# Altium schematic symbol library Schlib.SchLib: 725 symbols (part 6 of 6)
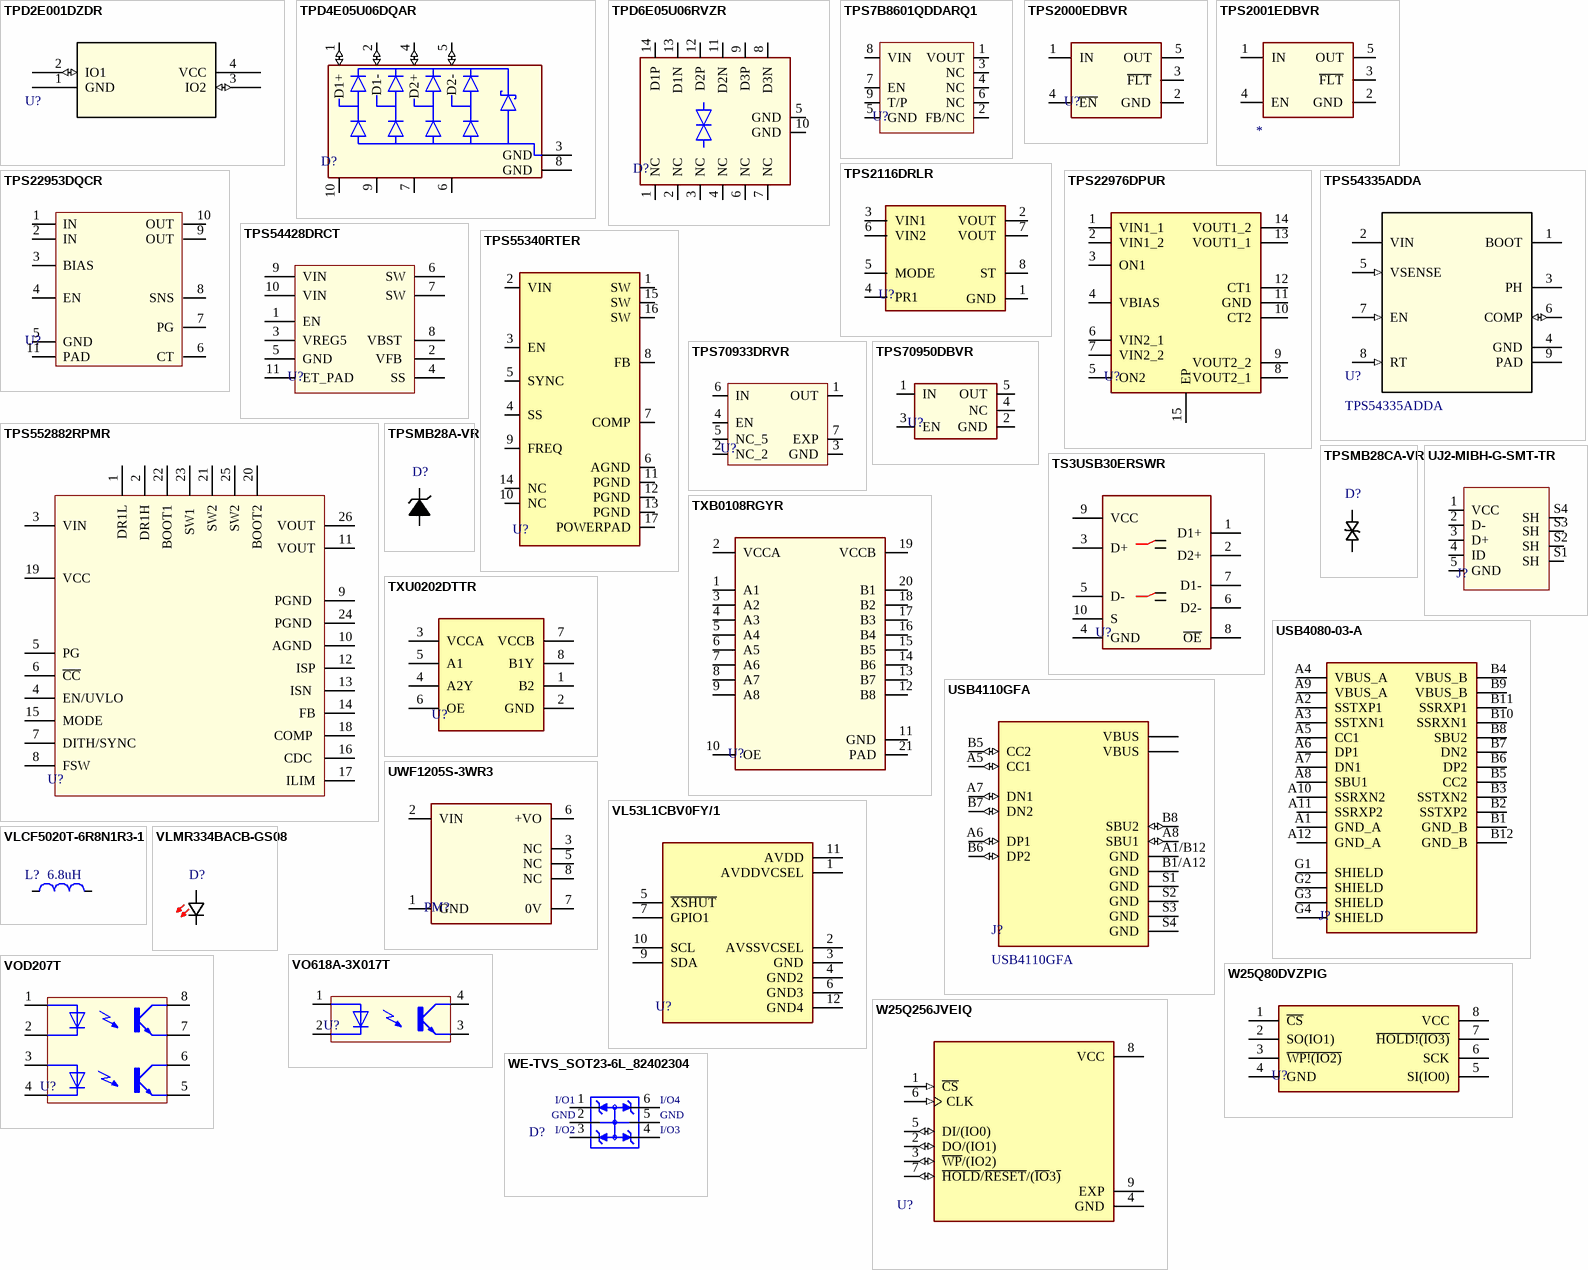
[diagram p26: symbols TPD2E001DZDR to WE-TVS_SOT23-6L_82402304]

## TPD4E05U06DQAR
designator D?  (value not drawn)
Quad 0.5-pF, 5.5-V, ±12-kV ESD protection diode for USB, HDMI & High Speed Interfaces; Manufacturer: Texas Instruments; Manufacturer Part Number: TPD4E05U06DQAR; Direction: Unidirectional; Clamping Voltage: 14V; Working Voltage: 5.5V; Value: 0.5pF; Number of Bidirectional Channels: 4; Min Breakdown Voltage: 6V; Peak Pulse Power: 40W; Power Line Protection: Yes; Leakage Current: 10nA; Peak Pulse Current: 2.5A; Interface: LVDS,USB,Ethernet,HDMI,PCIe,SATA; Supplier: Digi-Key; Supplier Part Number: 296-35765-1-ND; RoHS: Yes; Category: Integrated Circuits (ICs); Stock: 300543; Pricing: 1=0.73000, 10=0.64300, 100=0.49310, 500=0.38980, 1000=0.31184 (USD); Mounting Technology: Surface Mount; Case/Package: SON; Pins: 10; Contact Plating: Gold; Min Operating Temperature: -40°C; Max Operating Temperature: 125°C; Packaging: Tape and Reel; Package Quantity: 3000; Polarity: Unidirectional; Reverse Standoff Voltage: 5.5V; Number of Channels: 4; Breakdown Voltage: 6V; Max Power Dissipation: 40W; Termination: SMD/SMT; Operating Supply Voltage: 5.5V; Series: -; Number of Unidirectional Channels: 4; Length: 2.6mm; Depth: 1.1mm; Radiation Hardening: No; Reach SVHC Compliant: Yes; Lead Free: Lead Free; RoHS Compliant: Yes; ComponentLink1URL: https://datasheet.ciiva.com/15063/tpd4e05u06-15063653.pdf?src-supplier=Digi-Key; ComponentLink1Description: https://datasheet.ciiva.com/15063/tpd4e05u06-15063653.pdf?src-supplier=Digi-Key; ComponentLink2URL: https://datasheet.ciiva.com/24119/slvsbo7f-316827-24119436.pdf?src-supplier=Mouser; ComponentLink2Description: https://datasheet.ciiva.com/24119/slvsbo7f-316827-24119436.pdf?src-supplier=Mouser; ComponentLink3URL: https://datasheet.ciiva.com/26918/getdatasheetpartid-716763-26918024.pdf?src-supplier=Verical; ComponentLink3Description: https://datasheet.ciiva.com/26918/getdatasheetpartid-716763-26918024.pdf?src-supplier=Verical; ComponentLink4URL: https://datasheet.ciiva.com/15063/tpd4e05u06-15063654.pdf?src-supplier=Digi-Key; ComponentLink4Description: https://datasheet.ciiva.com/15063/tpd4e05u06-15063654.pdf?src-supplier=Digi-Key; ComponentLink5URL: https://datasheet.ciiva.com/15063/tpd4e05u06-15063655.pdf?src-supplier=Digi-Key; ComponentLink5Description: https://datasheet.ciiva.com/15063/tpd4e05u06-15063655.pdf?src-supplier=Digi-Key; ComponentLink6URL: https://datasheet.ciiva.com/29883/tpd4e05u06-29883798.pdf?src-supplier=Avnet; ComponentLink6Description: https://datasheet.ciiva.com/29883/tpd4e05u06-29883798.pdf?src-supplier=Avnet
footprint TPD4E05U06DQAR
pins: 1 D1+ (io), 2 D1- (io), 3 GND (power), 4 D2+ (io), 5 D2- (io), 6 NC_6, 7 NC_7, 8 GND (power), 9 NC_9, 10 NC_10

## TPD6E05U06RVZR
designator D?  (value not drawn)
ESD Suppressor Diode Array ±15kV@Air Gap/±12kV@Contact Disc 14-Pin UQFN T/R; Manufacturer: Texas Instruments; Manufacturer Part Number: TPD6E05U06RVZR; Direction: Unidirectional; Number of Bidirectional Channels: 6; Reverse Standoff Voltage: 5.5V; Min Breakdown Voltage: 6V; Clamping Voltage: 14V; Peak Pulse Power: 40W; Power Line Protection: Yes; Polarity: Bidirectional; Leakage Current: 10nA; Peak Pulse Current: 2.5A; Interface: LVDS,USB,Ethernet,HDMI,PCIe,SATA; Supplier: Digi-Key; Supplier Part Number: 296-39349-1-ND; RoHS: Yes; Category: ESD and Circuit Protection ICs; Stock: 69689; Pricing: 1=0.99000, 10=0.88400, 100=0.68900, 500=0.56918, 1000=0.44935 (USD); Mounting Technology: Surface Mount; Pins: 14; Min Operating Temperature: -40°C; Max Operating Temperature: 125°C; Packaging: Tape and Reel; Package Quantity: 3000; Number of Channels: 6; Breakdown Voltage: 6V; Termination: SMD/SMT; Max Power Dissipation: 40W; Working Voltage: 5.5V; Length: 3.6mm; Depth: 1.45mm; Radiation Hardening: No; Lead Free: Lead Free; RoHS Compliant: Yes; ComponentLink1URL: https://datasheet.ciiva.com/29883/tpd6e05u06-29883847.pdf?src-supplier=Avnet; ComponentLink1Description: https://datasheet.ciiva.com/29883/tpd6e05u06-29883847.pdf?src-supplier=Avnet; ComponentLink2URL: https://datasheet.ciiva.com/26918/getdatasheetpartid-747210-26918045.pdf?src-supplier=Verical; ComponentLink2Description: https://datasheet.ciiva.com/26918/getdatasheetpartid-747210-26918045.pdf?src-supplier=Verical
footprint TPD6E05U06RVZR
pins: 1 NC, 2 NC, 3 NC, 4 NC, 5 GND (power), 6 NC, 7 NC, 8 D3N (io), 9 D3P (io), 10 GND (power), 11 D2N (io), 12 D2P (io), 13 D1N (io), 14 D1P (io)

## TPS7B8601QDDARQ1
designator U?  (value not drawn)
Automotive 500-mA, 40-V, ultra-low-IQ, low-dropout (LDO) linear regulator with power good 8-SO PowerPAD -40 to 150; Manufacturer: Texas Instruments; Manufacturer Part Number: TPS7B8601QDDARQ1; Supplier: Mouser; Supplier Part Number: 595-TPS7B8601QDDARQ1; RoHS: Yes; Category: Integrated Circuits (ICs); Stock: 7301; Pricing: 1=2.19, 10=1.86, 50=1.86, 100=1.58, 1000=1.08, 10000=0.975 (USD); RoHS Compliant: Yes
footprint TPS7B8601QDDARQ1
pins: 1 VOUT, 2 FB/NC, 3 NC, 4 NC, 5 GND, 6 NC, 7 EN, 8 VIN, 9 T/P

## TPS2000EDBVR
designator U?  (value not drawn)
2-A loading, 2.7-V to 5.5-V, 70-mΩ USB power switch, active low, output discharge, reverse blocking 5-SOT-23 -40 to 125; Manufacturer: Texas Instruments; Manufacturer Part Number: TPS2000EDBVR; Supplier: Mouser; Supplier Part Number: 595-TPS2000EDBVR; RoHS: No; Stock: 5278; Pricing: 1=0.29, 10=0.196, 50=0.174, 100=0.15, 1000=0.125, 10000=0.11 (USD)
footprint SOT-23-5
pins: 1 IN, 2 GND, 3 ~{FLT}, 4 ~{EN}, 5 OUT

## TPS2001EDBVR
designator U?
2-A loading, 2.7-V to 5.5-V, 70-mΩ USB power switch, active high, output discharge, reverse blocking 5-SOT-23 -40 to...; Manufacturer: Texas Instruments; Manufacturer Part Number: TPS2001EDBVR; Supplier: Mouser; Supplier Part Number: 595-TPS2001EDBVR; RoHS: No; Stock: 5271; Pricing: 1=0.29, 10=0.196, 50=0.174, 100=0.15, 1000=0.125, 10000=0.11 (USD); Case/Package: SOT-23; Pins: 5; Length: 2.9mm; Width: 1.6mm; Height: 1.45mm; Thickness: 1.2mm
footprint SOT-23-5
pins: 1 IN, 2 GND, 3 ~{FLT}, 4 EN, 5 OUT

## TPS2116DRLR
designator U?  (value not drawn)
1.6-V to 5.5-V, 40-mΩ, 2.5-A, low-IQ, priority power multiplexer ; 8-SOT-5X3 -40 to 125; Manufacturer: Texas Instruments; Manufacturer Part Number: TPS2116DRLR; Manufacturer Lifecycle Status: ACTIVE; Number of Channels: 2; Value: 40mΩ; Supplier: DigiKey; Supplier Part Number: 296-TPS2116DRLRCT-ND; RoHS: Compliant; Category: Power Switch ICs - Power Distribution; Stock: 25240; Pricing: 1=0.9, 10=0.647, 25=0.5832, 100=0.5127, 250=0.47912, 500=0.4589, 1000=0.44223 (USD); Height: 0m; Length: 2.1mm; Lifecycle Status: Production; Pins: 8; Thickness: 550µm; Width: 1.2mm; ComponentLink1URL: https://sigma.octopart.com:443/184160452/technical_drawing/Texas-Instruments-TPS2116DRLR.pdf?src-supplier=Texas+Instruments; ComponentLink1Description: https://sigma.octopart.com:443/184160452/technical_drawing/Texas-Instruments-TPS2116DRLR.pdf?src-supplier=Texas+Instruments; ComponentLink2URL: https://octopart.com:443/opatz8j6/c1?t=4XrEd-4Z0GvzwrKdrlPU7--aYnQ3PRki3d6vYV32tWtr0x4CGuKypNct5cgJOcaYu9izsYh09Rfb44Tw0ac0Vgt6gZBMRBsKylaRsa0OYVnbAET_580j-HT-IhgsROBPfLzQ7Tab99TEEetPRPkHcH2lMAIohwu31g3GOnKcXTYb_8nHCEcsDe0ff6zhxHwgLDhA80dqWQO3J6Vc5b3XZ7pFwC5M0RX7Pw5y5OBWv5VcqLl3ABV3D0tfA-9wY1cAEU4o7e_r1C5S5X3FKWsHki8Ji71jG8GfO2d6KawGjfpVVeg0LYH_EDaUWboAOOK7oSV-4JGns9_iNWJZmOzZu4j0QQ0BKGYKn_xy9Bk7nAVMVmOKRYXANoPdB2YygZHenazLnmUk&src-supplier=Texas+Instruments; ComponentLink2Description: https://octopart.com:443/opatz8j6/c1?t=4XrEd-4Z0GvzwrKdrlPU7--aYnQ3PRki3d6vYV32tWtr0x4CGuKypNct5cgJOcaYu9izsYh09Rfb44Tw0ac0Vgt6gZBMRBsKylaRsa0OYVnbAET_580j-HT-IhgsROBPfLzQ7Tab99TEEetPRPkHcH2lMAIohwu31g3GOnKcXTYb_8nHCEcsDe0ff6zhxHwgLDhA80dqWQO3J6Vc5b3XZ7pFwC5M0RX7Pw5y5OBWv5VcqLl3ABV3D0tfA-9wY1cAEU4o7e_r1C5S5X3FKWsHki8Ji71jG8GfO2d6KawGjfpVVeg0LYH_EDaUWboAOOK7oSV-4JGns9_iNWJZmOzZu4j0QQ0BKGYKn_xy9Bk7nAVMVmOKRYXANoPdB2YygZHenazLnmUk&src-supplier=Texas+Instruments; ComponentLink3URL: https://sigma.octopart.com:443/182665545/technical_drawing/Texas-Instruments-TPS2116DRLR.pdf?src-supplier=Texas+Instruments; ComponentLink3Description: https://sigma.octopart.com:443/182665545/technical_drawing/Texas-Instruments-TPS2116DRLR.pdf?src-supplier=Texas+Instruments; ComponentLink4URL: https://sigma.octopart.com:443/158891806/technical_drawing/Texas-Instruments-TPS2116DRLR.pdf?src-supplier=Texas+Instruments; ComponentLink4Description: https://sigma.octopart.com:443/158891806/technical_drawing/Texas-Instruments-TPS2116DRLR.pdf?src-supplier=Texas+Instruments; ComponentLink5URL: https://sigma.octopart.com:443/157894082/technical_drawing/Texas-Instruments-TPS2116DRLR.pdf?src-supplier=Texas+Instruments; ComponentLink5Description: https://sigma.octopart.com:443/157894082/technical_drawing/Texas-Instruments-TPS2116DRLR.pdf?src-supplier=Texas+Instruments; ComponentLink6URL: https://sigma.octopart.com:443/154719996/technical_drawing/Texas-Instruments-TPS2116DRLR.pdf?src-supplier=Texas+Instruments; ComponentLink6Description: https://sigma.octopart.com:443/154719996/technical_drawing/Texas-Instruments-TPS2116DRLR.pdf?src-supplier=Texas+Instruments; ComponentLink7URL: https://sigma.octopart.com:443/151526441/technical_drawing/Texas-Instruments-TPS2116DRLR.pdf?src-supplier=Texas+Instruments; ComponentLink7Description: https://sigma.octopart.com:443/151526441/technical_drawing/Texas-Instruments-TPS2116DRLR.pdf?src-supplier=Texas+Instruments; ComponentLink8URL: https://datasheet.octopart.com:443/TPS2116DRLR-Texas-Instruments-datasheet-165812031.pdf?src-supplier=Augswan; ComponentLink8Description: https://datasheet.octopart.com:443/TPS2116DRLR-Texas-Instruments-datasheet-165812031.pdf?src-supplier=Augswan; ComponentLink9URL: https://datasheet.octopart.com:443/TPS2116DRLR-Texas-Instruments-datasheet-166221714.pdf?src-supplier=LCSC; ComponentLink9Description: https://datasheet.octopart.com:443/TPS2116DRLR-Texas-Instruments-datasheet-166221714.pdf?src-supplier=LCSC; ComponentLink10URL: http://sigma.octopart.com:80/conflict_mineral_statement/Texas-Instruments-company-63.pdf?src-supplier=Compliance+Statements; ComponentLink10Description: http://sigma.octopart.com:80/conflict_mineral_statement/Texas-Instruments-company-63.pdf?src-supplier=Compliance+Statements; ComponentLink11URL: http://sigma.octopart.com:80/reach_statement/Texas-Instruments-company-64.pdf?src-supplier=Compliance+Statements; ComponentLink11Description: http://sigma.octopart.com:80/reach_statement/Texas-Instruments-company-64.pdf?src-supplier=Compliance+Statements
footprint SOT-583
pins: 1 GND, 2 VOUT, 3 VIN1, 4 PR1, 5 MODE, 6 VIN2, 7 VOUT, 8 ST

## TPS22953DQCR
designator U?  (value not drawn)
5.7-V, 5-A, 14-mΩ load switch with adj. rise time, -Voltage monitoring 10-WSON -40 to 105; Manufacturer: Texas Instruments; Manufacturer Part Number: TPS22953DQCR; Number of Outputs: 1; Interface: On/Off; Max Output current: 5A; Fault Protection: Over Temperature,Reverse Current; Output Configuration: High Side; Supplier: Digi-Key; Supplier Part Number: 296-47227-1-ND; RoHS: Yes; Category: Embedded Processors and Controllers; Stock: 8695; Pricing: 1=1.01000, 10=0.89900, 25=0.85320, 100=0.70090, 250=0.65516, 500=0.57898, 1000=0.45709 (USD); Min Operating Temperature: -40°C; Max Operating Temperature: 105°C; Packaging: Tape and Reel; Number of Channels: 1; Lead Free: Lead Free; RoHS Compliant: Yes; ComponentLink1URL: http://www.ti.com/lit/ds/symlink/tps22953.pdf?src-supplier=Digi-Key; ComponentLink1Description: http://www.ti.com/lit/ds/symlink/tps22953.pdf?src-supplier=Digi-Key; ComponentLink2URL: http://www.ti.com/general/docs/suppproductinfo.tsp?distId=10&amp;gotoUrl=http%3A%2F%2Fwww.ti.com%2Flit%2Fgpn%2Ftps22953&src-supplier=Digi-Key; ComponentLink2Description: http://www.ti.com/general/docs/suppproductinfo.tsp?distId=10&amp;gotoUrl=http%3A%2F%2Fwww.ti.com%2Flit%2Fgpn%2Ftps22953&src-supplier=Digi-Key; ComponentLink3URL: http://www.ti.com/lit/gpn/tps22953?src-supplier=Mouser; ComponentLink3Description: http://www.ti.com/lit/gpn/tps22953?src-supplier=Mouser
footprint TPS22953DQCR
pins: 1 IN, 2 IN, 3 BIAS, 4 EN, 5 GND, 6 CT, 7 PG, 8 SNS, 9 OUT, 10 OUT, 11 PAD

## TPS22976DPUR
designator U?  (value not drawn)
Tape & Reel (TR) TPS22976 Over Temperature SINK power distribution switch 3mm 5V 6A 14m Ohm; Manufacturer: Texas Instruments; Manufacturer Part Number: TPS22976DPUR; Supplier: Mouser; Supplier Part Number: 595-TPS22976DPUR; RoHS: Yes; Category: Integrated Circuits (ICs); Stock: 11295; Pricing: 1=0.58, 10=0.404, 50=0.363, 100=0.316, 1000=0.257, 10000=0.22 (USD); Length: 3mm; Width: 2mm; Height: 800um; Thickness: 750um; RoHS Compliant: 5897YesNo; ComponentLink1URL: http://www.ti.com/general/docs/suppproductinfo.tsp?distId=10&amp;gotoUrl=http%3A%2F%2Fwww.ti.com%2Flit%2Fgpn%2Ftps22976&src-supplier=Digikey; ComponentLink1Description: http://www.ti.com/general/docs/suppproductinfo.tsp?distId=10&amp;gotoUrl=http%3A%2F%2Fwww.ti.com%2Flit%2Fgpn%2Ftps22976&src-supplier=Digikey; ComponentLink2URL: http://www.ti.com/lit/ds/symlink/tps22976.pdf?src-supplier=Digikey; ComponentLink2Description: http://www.ti.com/lit/ds/symlink/tps22976.pdf?src-supplier=Digikey
footprint TPS22976DPUR
pins: 1 VIN1_1, 2 VIN1_2, 3 ON1, 4 VBIAS, 5 ON2, 6 VIN2_1, 7 VIN2_2, 8 VOUT2_1, 9 VOUT2_2, 10 CT2, 11 GND, 12 CT1, 13 VOUT1_1, 14 VOUT1_2, 15 EP

## TPS54335ADDA
designator U?
4.5V to 28V Input, 3A, Synchronous, Step-Down Converter with Eco-mode; Manufacturer Part Number: TPS54335ADDA; ComponentLink1URL: https://datasheet.ciiva.com/48512/tps54361-q1-48512600.pdf?src-supplier=Avnet; ComponentLink1Description: https://datasheet.ciiva.com/48512/tps54361-q1-48512600.pdf?src-supplier=Avnet
footprint DDA0008E_L
pins: 1 BOOT (power), 2 VIN (power), 3 PH (power), 4 GND (power), 5 VSENSE (in), 6 COMP (io), 7 EN (in), 8 RT (in), 9 PAD (power)

## TPS54428DRCT
designator U?  (value not drawn)
4.5V to 18V Input, 4-A Synchronous Step-Down SWIFT Converter with Eco-mode 10-VSON -40 to 85; Manufacturer: Texas Instruments; Manufacturer Part Number: TPS54428DRCT; Number of Outputs: 1; Output Current: 4A; Output Voltage: 7V; Switching Frequency: 650kHz; Min Output Voltage: 760mV; Synchronous Rectifier: Yes; Quiescent Current: 950uA; Output Type: Adjustable; Output Configuration: Positive; Supplier: Digi-Key; Supplier Part Number: 296-35758-1-ND; RoHS: Yes; Category: Voltage Regulators - Switching; Stock: 1114; Pricing: 1=2.01000, 10=1.80900, 25=1.70640, 100=1.45400 (USD); Mounting Technology: Surface Mount; Case/Package: SON; Pins: 10; Weight: 0.001058oz; Min Operating Temperature: -40°C; Max Operating Temperature: 85°C; Packaging: Tape and Reel; Min Input Voltage: 4.5V; Package Quantity: 250; Max Output current: 4A; Max Supply Voltage: 18V; Min Supply Voltage: 4.5V; Max Output Voltage: 7V; Operating Supply Current: 950uA; Operating Supply Voltage: 18V; Series: D-CAP2™, Eco-Mode™; Length: 3.1mm; Width: 3.1mm; Height: 0.95mm; Radiation Hardening: No; Reach SVHC Compliant: Yes; Lead Free: Lead Free; RoHS Compliant: Yes; ComponentLink1URL: https://datasheet.ciiva.com/22684/1882448-22684533.pdf?src-supplier=Element14; ComponentLink1Description: https://datasheet.ciiva.com/22684/1882448-22684533.pdf?src-supplier=Element14; ComponentLink2URL: https://datasheet.ciiva.com/15082/tps54428-15082282.pdf?src-supplier=Digi-Key; ComponentLink2Description: https://datasheet.ciiva.com/15082/tps54428-15082282.pdf?src-supplier=Digi-Key; ComponentLink3URL: https://datasheet.ciiva.com/15082/tps54428-15082281.pdf?src-supplier=Digi-Key; ComponentLink3Description: https://datasheet.ciiva.com/15082/tps54428-15082281.pdf?src-supplier=Digi-Key; ComponentLink4URL: https://datasheet.ciiva.com/15082/tps54428-15082283.pdf?src-supplier=Digi-Key; ComponentLink4Description: https://datasheet.ciiva.com/15082/tps54428-15082283.pdf?src-supplier=Digi-Key; ComponentLink5URL: https://datasheet.ciiva.com/29885/tps54428-29885689.pdf?src-supplier=Avnet; ComponentLink5Description: https://datasheet.ciiva.com/29885/tps54428-29885689.pdf?src-supplier=Avnet
footprint TPS54428DRCT
pins: 1 EN, 2 VFB , 3 VREG5, 4 SS, 5 GND , 6 SW, 7 SW, 8 VBST , 9 VIN, 10 VIN, 11 ET_PAD

## TPS55340RTER
designator U?  (value not drawn)
5-A, 40-V, wide VIN boost, flyback, & SEPIC converter 16-WQFN -40 to 150; Manufacturer: Texas Instruments; Manufacturer Part Number: TPS55340RTER; Supplier: Mouser; Supplier Part Number: 595-TPS55340RTER; RoHS: Yes; Category: Voltage Regulators - Switching; Stock: 9981; Pricing: 1=2.75, 10=2.34, 50=2.34, 100=1.99, 1000=1.36, 10000=1.21 (USD); ComponentLink1URL: https://datasheet.ciiva.com/41798/tps55340-41798808.pdf?src-supplier=Digikey; ComponentLink1Description: https://datasheet.ciiva.com/41798/tps55340-41798808.pdf?src-supplier=Digikey; ComponentLink2URL: https://datasheet.ciiva.com/14377/tps55340-14377094.pdf?src-supplier=Avnet; ComponentLink2Description: https://datasheet.ciiva.com/14377/tps55340-14377094.pdf?src-supplier=Avnet
footprint TPS55340RTER
pins: 1 SW, 2 VIN, 3 EN, 4 SS, 5 SYNC, 6 AGND, 7 COMP, 8 FB, 9 FREQ, 10 NC, 11 PGND, 12 PGND, 13 PGND, 14 NC, 15 SW, 16 SW, 17 POWERPAD

## TPS70933DRVR
designator U?  (value not drawn)
LDO Regulator Positive 3.3V 0.15A 6-Pin SON T/R; Manufacturer: Texas Instruments; Manufacturer Part Number: TPS70933DRVR; Max Supply Voltage: 30V; Min Supply Voltage: 2.7V; Supplier: Mouser; Supplier Part Number: 595-TPS70933DRVR; RoHS: Yes; Category: Voltage Regulators - Linear; Stock: 21653; Pricing: 1=1.21, 10=1.02, 50=1.02, 100=0.773, 1000=0.548, 10000=0.467 (USD); Length: 2mm; Width: 2mm; Height: 800um; Thickness: 750um; ComponentLink1URL: http://www.ti.com/lit/ds/symlink/tps70925.pdf?src-supplier=Avnet; ComponentLink1Description: http://www.ti.com/lit/ds/symlink/tps70925.pdf?src-supplier=Avnet; ComponentLink2URL: http://www.ti.com/lit/ds/symlink/tps709.pdf?src-supplier=Digikey; ComponentLink2Description: http://www.ti.com/lit/ds/symlink/tps709.pdf?src-supplier=Digikey; ComponentLink3URL: http://www.ti.com/general/docs/suppproductinfo.tsp?distId=10&amp;gotoUrl=http%3A%2F%2Fwww.ti.com%2Flit%2Fgpn%2Ftps709&src-supplier=Digikey; ComponentLink3Description: http://www.ti.com/general/docs/suppproductinfo.tsp?distId=10&amp;gotoUrl=http%3A%2F%2Fwww.ti.com%2Flit%2Fgpn%2Ftps709&src-supplier=Digikey; ComponentLink4URL: http://www.ti.com/lit/ds/symlink/tps70925.pdf?src-supplier=Digikey; ComponentLink4Description: http://www.ti.com/lit/ds/symlink/tps70925.pdf?src-supplier=Digikey
footprint TPS70933DRVR
pins: 1 OUT, 2 NC_2, 3 GND, 4 EN, 5 NC_5, 6 IN, 7 EXP

## TPS70950DBVR
designator U?  (value not drawn)
Linear Voltage Regulator IC Positive Fixed 1 Output 5V 150mA SOT-23-5; Manufacturer: Texas Instruments; Manufacturer Part Number: TPS70950DBVR; Supplier: Mouser; Supplier Part Number: 595-TPS70950DBVR; RoHS: Yes; Category: Voltage Regulators - Linear; Stock: 31949; Pricing: 1=1.29, 10=1.16, 50=1.16, 100=0.908, 1000=0.592, 10000=0.505 (USD); ComponentLink1URL: https://datasheet.ciiva.com/6580/tps70933-6580912.pdf?src-supplier=Digikey; ComponentLink1Description: https://datasheet.ciiva.com/6580/tps70933-6580912.pdf?src-supplier=Digikey
footprint SOT-23-5
pins: 1 IN, 2 GND, 3 EN, 4 NC, 5 OUT

## TPS552882RPMR
designator U?  (value not drawn)
36-V, 16-A buck-boost converter 26-VQFN-HR -40 to 125; Manufacturer: Texas Instruments; Manufacturer Part Number: TPS552882RPMR; Supplier: Digi-Key; Supplier Part Number: 296-TPS552882RPMRCT-ND; RoHS: Yes; Category: Voltage Regulators - Switching; Stock: 439; Pricing: 1=6.36000, 10=5.74300, 25=5.47600, 100=4.75470, 250=4.54104, 500=4.14036, 1000=3.78000 (USD)
pins: 1 DR1L, 2 DR1H, 3 VIN , 4 EN/UVLO , 5 PG , 6 ~{CC} , 7 DITH/SYNC , 8 FSW , 9 PGND , 10 AGND , 11 VOUT, 12 ISP, 13 ISN , 14 FB, 15 MODE, 16 CDC , 17 ILIM, 18 COMP , 19 VCC , 20 BOOT2, 21 SW2, 22 BOOT1, 23 SW1 , 24 PGND , 25 SW2, 26 VOUT

## TPSMB28A-VR
designator D?  (value not drawn)
Tvs Surf Mt Do214Aa Aeq101 Tr/Tr |Littelfuse TPSMB28A-VR; Diode Type: ZENER; Number of Unidirectional Channels: 1; Reverse Standoff Voltage: 28V; Min Breakdown Voltage: 31.1V; Peak Pulse Current: 13.3A; Peak Pulse Power: 600W; Power Line Protection: No; Clamping Voltage: 45.4V; Max Breakdown Voltage: 34.4V; Max Reverse Leakage Current: 1uA; Test Current: 1mA; Supplier: Mouser; Supplier Part Number: 576-TPSMB28A-VR; Manufacturer: Littelfuse; Manufacturer Part Number: TPSMB28A-VR; RoHS: Yes; Category: TVS Diodes; Stock: 2690; Pricing: 1=0.52, 10=0.441, 50=0.441, 100=0.307, 1000=0.209, 10000=0.144 (USD); Mounting Technology: Surface Mount; Min Operating Temperature: -65°C; Max Operating Temperature: 175°C; Series: Automotive, AEC-Q101, TPSMB-VR; Packaging: Cut Tape; Reverse Voltage: 28V; RoHS Compliant: Yes; ComponentLink1URL: https://www.littelfuse.com/~/media/electronics/datasheets/tvs_diodes/littelfuse_tvs_diode_tpsmb_vr_datasheet.pdf.pdf?src-supplier=Digikey; ComponentLink1Description: https://www.littelfuse.com/~/media/electronics/datasheets/tvs_diodes/littelfuse_tvs_diode_tpsmb_vr_datasheet.pdf.pdf?src-supplier=Digikey
footprint DO-214AA_SMB
pins: 1 C, 2 A

## TPSMB28CA-VR
designator D?  (value not drawn)
Tvs Surf Mt Do214Aa Aeq101 Tr / Tr Rohs Compliant: Yes; Manufacturer: Littelfuse; Manufacturer Part Number: TPSMB28CA-VR; Diode Type: ZENER; Number of Bidirectional Channels: 1; Reverse Standoff Voltage: 28V; Min Breakdown Voltage: 31.1V; Peak Pulse Current: 13.3A; Peak Pulse Power: 600W; Power Line Protection: No; Supplier: Mouser; Supplier Part Number: 576-TPSMB28CA-VR; RoHS: Yes; Category: TVS Diodes; Stock: 9519; Pricing: 1=0.51, 10=0.437, 50=0.437, 100=0.304, 1000=0.193, 10000=0.151 (USD); Mounting Technology: Surface Mount; Min Operating Temperature: -65°C; Max Operating Temperature: 175°C; Series: Automotive, AEC-Q101, TPSMB-VR; Packaging: Tape and Reel; RoHS Compliant: Yes
footprint DO-214AC, SMA
pins: 1, 2

## TS3USB30ERSWR
designator U?  (value not drawn)
IC USB SWITCH DUAL 1X2 10UQFN; Manufacturer: Texas Instruments; Manufacturer Part Number: TS3USB30ERSWR; Bandwidth: 900MHz; Number of Channels: 2; Max Supply Voltage: 4.3V; Min Supply Voltage: 3V; On-State Resistance: 10R; Operating Supply Current: 1uA; Supply Type: Single; Data Rate: 480Mbps; Number of Outputs: 4; Turn-On Delay Time: 25ns; Turn-Off Delay Time: 30ns; Polarity: Non-Inverting; High Level Output Current: 64mA; Supplier: Digi-Key; Supplier Part Number: 296-24684-1-ND; RoHS: Yes; Category: Interface ICs; Stock: 68346; Pricing: 1=1.66000, 10=1.48200, 25=1.40680, 100=1.15560, 250=1.08024, 500=0.95464, 1000=0.75366 (USD); Case/Package: QFN; Pins: 10; Weight: 0.000353oz; Contact Plating: Gold; Min Operating Temperature: -40°C; Max Operating Temperature: 85°C; Packaging: Tape and Reel; Package Quantity: 3000; Series: -; Number of Inputs: 2; Termination: SMD/SMT; Low Level Output Current: 64mA; -3db Bandwidth: 900MHz; Length: 1.85mm; Width: 1.45mm; Height: 0.5mm; Radiation Hardening: No; Lead Free: Lead Free; Reach SVHC Compliant: Yes; RoHS Compliant: Yes; ComponentLink1URL: https://datasheet.ciiva.com/1672/ts3usb30e-1672016.pdf?src-supplier=Digi-Key; ComponentLink1Description: https://datasheet.ciiva.com/1672/ts3usb30e-1672016.pdf?src-supplier=Digi-Key; ComponentLink2URL: https://datasheet.ciiva.com/14435/ts3usb30e-14435489.pdf?src-supplier=Avnet; ComponentLink2Description: https://datasheet.ciiva.com/14435/ts3usb30e-14435489.pdf?src-supplier=Avnet; ComponentLink3URL: https://datasheet.ciiva.com/15127/getdatasheetpartid-298587-15127652.pdf?src-supplier=Verical; ComponentLink3Description: https://datasheet.ciiva.com/15127/getdatasheetpartid-298587-15127652.pdf?src-supplier=Verical; ComponentLink4URL: https://datasheet.ciiva.com/41461/001187336-da-01-en-ic-usb-switch-ts3usb30erswr-uqfn-10-tid-41461645.pdf?src-supplier=Conrad; ComponentLink4Description: https://datasheet.ciiva.com/41461/001187336-da-01-en-ic-usb-switch-ts3usb30erswr-uqfn-10-tid-41461645.pdf?src-supplier=Conrad; ComponentLink5URL: https://datasheet.ciiva.com/1514/1719749-1514577.pdf?src-supplier=Element14; ComponentLink5Description: https://datasheet.ciiva.com/1514/1719749-1514577.pdf?src-supplier=Element14; ComponentLink6URL: https://datasheet.ciiva.com/22715/1882195-22715007.pdf?src-supplier=Element14; ComponentLink6Description: https://datasheet.ciiva.com/22715/1882195-22715007.pdf?src-supplier=Element14; ComponentLink7URL: https://datasheet.ciiva.com/28628/1882195-28628909.pdf?src-supplier=Element14; ComponentLink7Description: https://datasheet.ciiva.com/28628/1882195-28628909.pdf?src-supplier=Element14; ComponentLink8URL: https://datasheet.ciiva.com/1672/ts3usb30e-1672015.pdf?src-supplier=Digi-Key; ComponentLink8Description: https://datasheet.ciiva.com/1672/ts3usb30e-1672015.pdf?src-supplier=Digi-Key; ComponentLink9URL: https://datasheet.ciiva.com/1672/ts3usb30e-1672017.pdf?src-supplier=Digi-Key; ComponentLink9Description: https://datasheet.ciiva.com/1672/ts3usb30e-1672017.pdf?src-supplier=Digi-Key
footprint TS3USB30ERSWR
pins: 1 D1+, 2 D2+, 3 D+, 4 GND, 5 D-, 6 D2-, 7 D1-, 8 ~{OE}, 9 VCC, 10 S

## TXB0108RGYR
designator U?  (value not drawn)
IC 8-BIT TRNSLTR 15KV ESD 20VQFN; Manufacturer: Texas Instruments; Manufacturer Part Number: TXB0108RGYR; Data Rate: 100Mbps; Number of Channels: 8; Propagation Delay: 9.5ns; Max Supply Voltage: 5.5V; Min Supply Voltage: 1.2V; Logic Function: Translator; Turn-On Delay Time: 35.6ns; Low Level Output Current: 20uA; High Level Output Current: -20uA; Quiescent Current: 3.5uA; Output Type: 3-STATE; Channel Type: Bidirectional; Number of Circuits: 1; Rise Time: 0.8ns; Nominal Supply Current: 10uA; Supplier: Mouser; Supplier Part Number: 595-TXB0108RGYR; RoHS: Yes; Category: Voltage Level Shifters; Stock: 21756; Pricing: 1=1.63000, 10=1.46000, 50=1.38000, 100=1.18000, 1000=0.80200, 10000=0.80100 (USD); Mounting Technology: Surface Mount; Case/Package: VQFN EP; Pins: 20; Weight: 0.001517oz; Contact Plating: Gold; Min Operating Temperature: -40°C; Max Operating Temperature: 85°C; Package Quantity: 3000; Packaging: Tape and Reel; Number of Bits: 8; Series: -; Number of Inputs: 8; Output Current: 20uA; Termination: SMD/SMT; Supply Current: 10uA; Length: 4.5mm; Width: 3.5mm; Height: 0.8mm; Radiation Hardening: No; Lead Free: Lead Free; RoHS Compliant: Yes; Reach SVHC Compliant: Yes; ComponentLink1URL: https://datasheet.ciiva.com/15096/getdatasheetpartid-172984-15096214.pdf?src-supplier=Verical; ComponentLink1Description: https://datasheet.ciiva.com/15096/getdatasheetpartid-172984-15096214.pdf?src-supplier=Verical; ComponentLink2URL: https://datasheet.ciiva.com/1508/1811182-1508728.pdf?src-supplier=Element14; ComponentLink2Description: https://datasheet.ciiva.com/1508/1811182-1508728.pdf?src-supplier=Element14; ComponentLink3URL: https://datasheet.ciiva.com/1899/txb0108-1899602.pdf?src-supplier=Digi-Key; ComponentLink3Description: https://datasheet.ciiva.com/1899/txb0108-1899602.pdf?src-supplier=Digi-Key; ComponentLink4URL: https://datasheet.ciiva.com/1899/txb0108-1899601.pdf?src-supplier=Digi-Key; ComponentLink4Description: https://datasheet.ciiva.com/1899/txb0108-1899601.pdf?src-supplier=Digi-Key; ComponentLink5URL: https://datasheet.ciiva.com/1899/txb0108-1899603.pdf?src-supplier=Digi-Key; ComponentLink5Description: https://datasheet.ciiva.com/1899/txb0108-1899603.pdf?src-supplier=Digi-Key
footprint TXB0108RGYR
pins: 1 A1, 2 VCCA, 3 A2, 4 A3, 5 A4, 6 A5, 7 A6, 8 A7, 9 A8, 10 OE, 11 GND (power), 12 B8, 13 B7, 14 B6, 15 B5, 16 B4, 17 B3, 18 B2, 19 VCCB, 20 B1, 21 PAD (power)
